# Altium footprint library General.PcbLib: 446 footprints (part 14 of 28)
Each footprint in its own frame and in the unit in brackets; x right, y up, seen from the top. Pads: shape width x height; smd on the part's side, far side on the other; paste and mask are expansions set on the pad; w line width, h text height; cw(c..) or ccw(c..) is an arc to the next point about the centre after c.
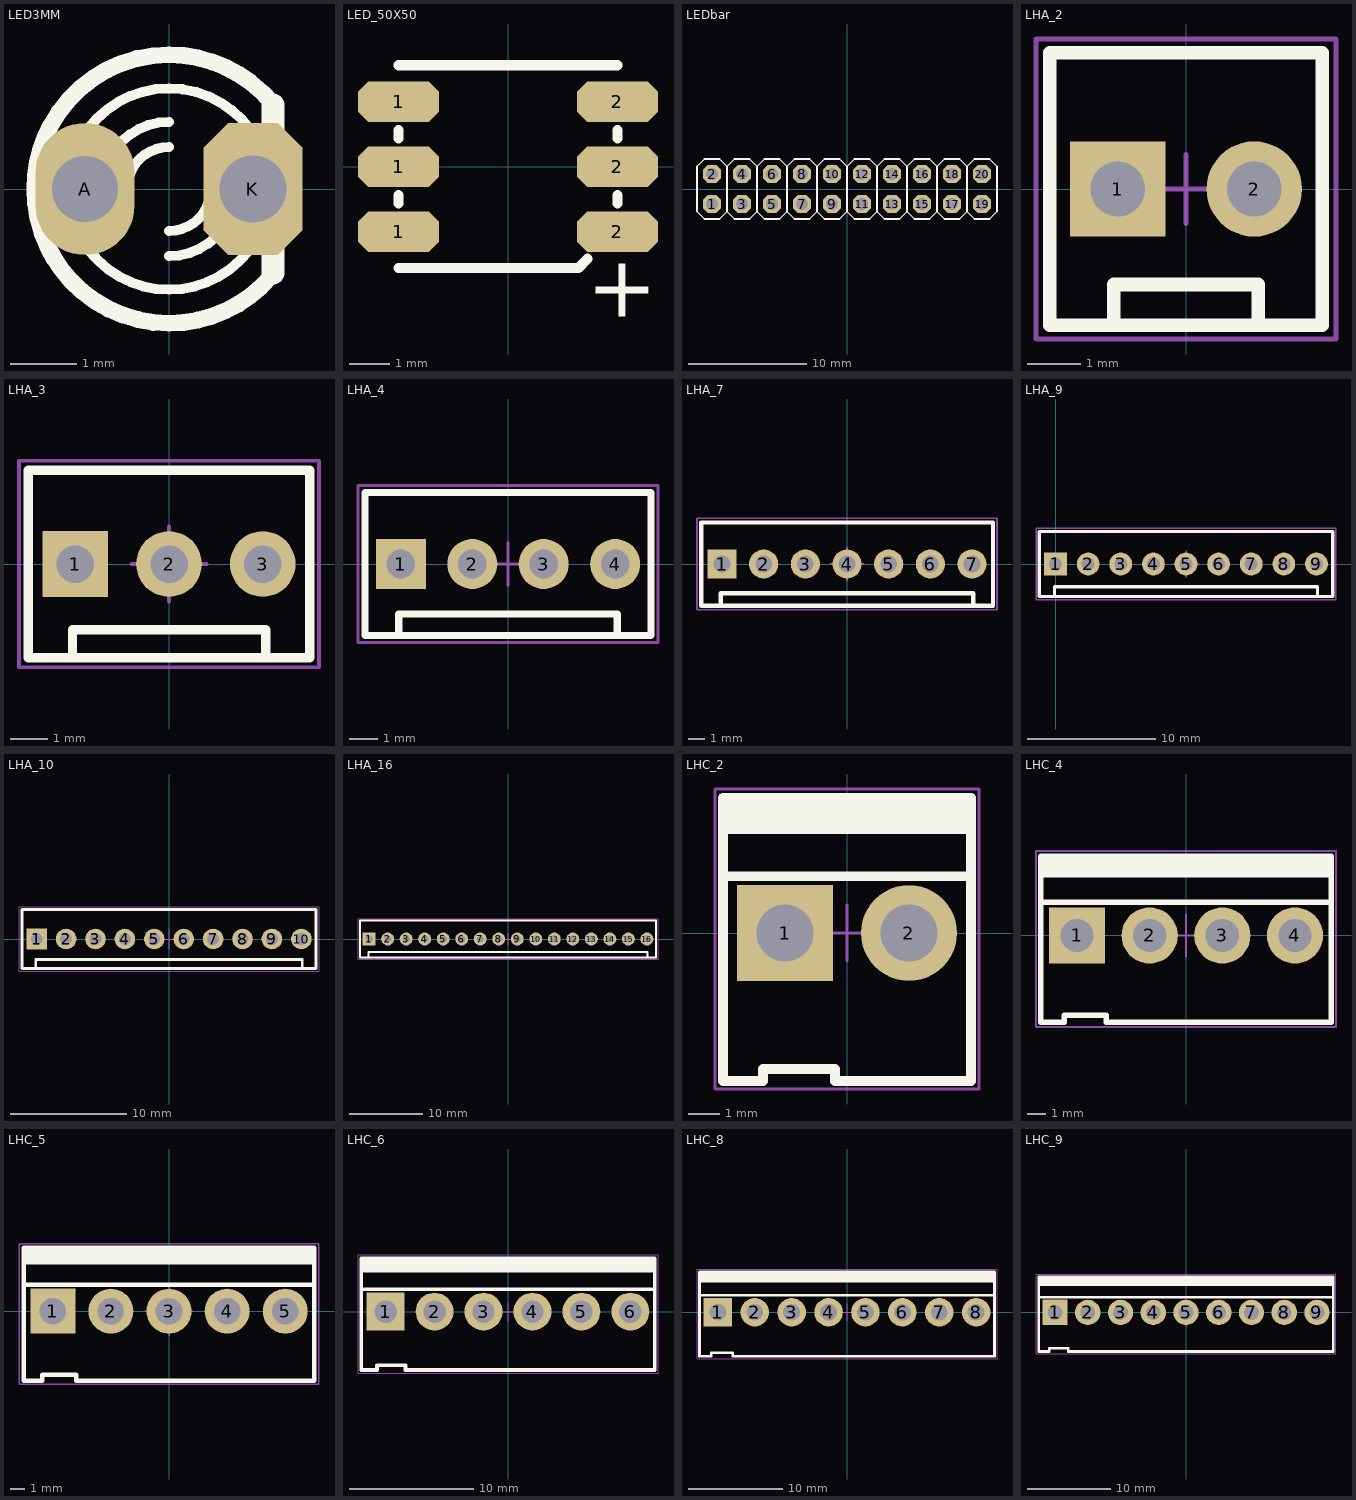
[diagram p13: the footprints below, top view; thin cyan lines are the x and y axes]

## LED3MM [mm]
pads (2):
  oval 1.5x2 hole 1: A(-1.27,0)
  oct 1.5x2 hole 1.016: K(1.27,0)
Top Overlay:
  lines w0.152: -1.219,0.914 cw(c0,0) 0,1.524 cw(c0,0) 1.24,0.886 ; -1.203,-0.936 ccw(c0,0) 0,-1.524 ccw(c0,0) 1.203,-0.936 ; -1.171,0.976 ccw(c0,0) -1.524,0 ccw(c0,0) -1.139,-1.012 ; -1.016,0 cw(c0,0) 0,1.016 ; -0.635,0 cw(c0,0) 0,0.635 ; 0,-1.016 ccw(c0,0) 1.016,0 ; 0,-0.635 ccw(c0,0) 0.635,0 ; 1.157,0.992 cw(c0,0) 1.524,0 cw(c0,0) 1.171,-0.976
  lines w0.254: -1.793,0.956 cw(c0,0) 0,2.032 cw(c0,0) 1.561,1.301 ; -1.789,0.963 ccw(c0,0) -2.032,0 ccw(c0,0) -1.731,-1.065 ; -1.764,-1.008 ccw(c0,0) 0,-2.032 ccw(c0,0) 1.551,-1.313
  lines w0.349: 1.575,-1.27 1.575,1.27
3D body "ALSRobot-LED Red 3mm.step": height 5.4, standoff -2.8, extent -1.946,-1.945 1.549,2.047

## LED_50X50 [mm] "SMD"
pads (6):
  oct 2x1 smd: 1(-2.7,-1.6) 1(-2.7,0) 1(-2.7,1.6) 2(2.7,-1.6) 2(2.7,0) 2(2.7,1.6)
Top Overlay:
  lines w0.254: -2.7,-2.5 1.734,-2.5 1.961,-2.273 ; -2.7,-0.9 -2.7,-0.7 ; -2.7,0.7 -2.7,0.9 ; -2.7,2.5 2.7,2.5 ; 2.7,-0.9 2.7,-0.7 ; 2.7,0.7 2.7,0.9
  text "+" at 1.946,-3.7 h1.52
3D body "LED_50X50.STEP": height 1.5, standoff -0.2, extent -2.708,-2.475 2.642,2.475

## LEDbar [mil]
pads (20):
  oct 60x60 hole 40: 1(-450,-50) 2(-450,50) 3(-350,-50) 4(-350,50) 5(-250,-50) 6(-250,50) 7(-150,-50) 8(-150,50) 9(-50,-50) 10(-50,50) 11(50,-50) 12(50,50) 13(150,-50) 14(150,50) 15(250,-50) 16(250,50) 17(350,-50) 18(350,50) 19(450,-50) 20(450,50)
Top Overlay:
  lines w6: -400,-75 -400,75 ; -400,-75 -375,-100 -325,-100 -300,-75 ; -400,-75 -425,-100 -475,-100 -500,-75 -500,75 -475,100 -425,100 -400,75 ; -400,75 -375,100 -325,100 -300,75 ; -300,-75 -300,75 ; -300,-75 -275,-100 -225,-100 -200,-75 ; -300,75 -275,100 -225,100 -200,75 ; -200,-75 -200,75 ; -200,-75 -175,-100 -125,-100 -100,-75 ; -200,75 -175,100 -125,100 -100,75 ; -100,-75 -100,75 ; -100,-75 -75,-100 -25,-100 0,-75 ; -100,75 -75,100 -25,100 0,75 ; 0,-75 0,75 ; 0,-75 25,-100 75,-100 100,-75 ; 0,75 25,100 75,100 100,75 ; 100,-75 100,75 ; 100,-75 125,-100 175,-100 200,-75 ; 100,75 125,100 175,100 200,75 ; 200,-75 200,75 ; 200,-75 225,-100 275,-100 300,-75 ; 200,75 225,100 275,100 300,75 ; 300,-75 300,75 ; 300,-75 325,-100 375,-100 400,-75 ; 300,75 325,100 375,100 400,75 ; 400,-75 425,-100 475,-100 500,-75 500,75 475,100 425,100 400,75 ; 400,-75 400,75
3D body "Segment Bar Graph or LED Array.step": height 318.11, standoff -81.89, extent -500,-383.86 500,159.45

## LHA_2 [mil] "Connector; Signal; 2 Position ,2.54mm Pitch"
height 452.76
pads (2):
  rect 70x70 hole 40: 1(-50,0)
  round 70 hole 40: 2(50,0)
Top Overlay:
  lines w10: -53,-100 -100,-100 -100,100 100,100 100,-100 53,-100 ; -53,-100 -53,-70 53,-70 53,-100 ; -53,-100 53,-100
Mechanical 13:
  lines w3.94: -53,-100 53,-100 ; -53,-100 -53,-70 53,-70 53,-100 ; -53,-100 -100,-100 -100,100 100,100 100,-100 53,-100 ; -63.78,-13.78 -36.22,-13.78 -36.22,13.78 -63.78,13.78 -63.78,-13.78 ; 36.22,-13.78 36.22,13.78 63.78,13.78 63.78,-13.78 36.22,-13.78
Mechanical 15:
  lines w3.94: -25,0 0,0 ; 0,-25 0,0 ; 0,25 0,0 ; 25,0 0,0 ; -110,-110 110,-110 110,110 -110,110 -110,-110
3D body: height 133.86, standoff 0, extent -99.98,-99.98 99.98,99.98
3D body: height 452.76, standoff 0, extent -52.98,-99.98 52.98,-70.02
3D body: height 425.2, standoff -133.86, extent -63.76,-13.76 -36.24,13.76
3D body: height 425.2, standoff -133.86, extent 36.24,-13.76 63.76,13.76

## LHA_3 [mil] "Connector; Signal; 3 Position ,2.54mm Pitch"
height 452.76
pads (3):
  rect 70x70 hole 40: 1(-100,0)
  round 70 hole 40: 2(0,0) 3(100,0)
Top Overlay:
  lines w10: -103,-100 -103,-70 103,-70 103,-100 ; -103,-100 103,-100 ; -103,-100 -150,-100 -150,100 150,100 150,-100 103,-100
Mechanical 13:
  lines w3.94: -103,-100 -150,-100 -150,100 150,100 150,-100 103,-100 ; -103,-100 103,-100 ; -103,-100 -103,-70 103,-70 103,-100 ; -113.78,-13.78 -86.22,-13.78 -86.22,13.78 -113.78,13.78 -113.78,-13.78 ; -13.78,-13.78 -13.78,13.78 13.78,13.78 13.78,-13.78 -13.78,-13.78 ; 86.22,-13.78 113.78,-13.78 113.78,13.78 86.22,13.78 86.22,-13.78
Mechanical 15:
  lines w3.94: -40,0 0,0 ; 0,-40 0,0 ; 0,40 0,0 ; 40,0 0,0 ; -160,-110 -160,110 160,110 160,-110 -160,-110
3D body: height 452.76, standoff 0, extent -102.98,-99.98 102.98,-70.02
3D body: height 133.86, standoff 0, extent -149.98,-99.98 149.98,99.98
3D body: height 425.2, standoff -133.86, extent -113.76,-13.76 -86.24,13.76
3D body: height 425.2, standoff -133.86, extent -13.76,-13.76 13.76,13.76
3D body: height 425.2, standoff -133.86, extent 86.24,-13.76 113.76,13.76

## LHA_4 [mil] "Connector; Signal; 4 Position ,2.54mm Pitch"
height 452.76
pads (4):
  rect 70x70 hole 40: 1(-150,0)
  round 70 hole 40: 2(-50,0) 3(50,0) 4(150,0)
Top Overlay:
  lines w10: -153,-100 -153,-70 153,-70 153,-100 ; -153,-100 153,-100 ; -153,-100 -200,-100 -200,100 200,100 200,-100 153,-100
Mechanical 13:
  lines w3.94: -153,-100 -200,-100 -200,100 200,100 200,-100 153,-100 ; -153,-100 153,-100 ; -153,-100 -153,-70 153,-70 153,-100 ; -163.78,-13.78 -136.22,-13.78 -136.22,13.78 -163.78,13.78 -163.78,-13.78 ; -63.78,-13.78 -63.78,13.78 -36.22,13.78 -36.22,-13.78 -63.78,-13.78 ; 36.22,-13.78 63.78,-13.78 63.78,13.78 36.22,13.78 36.22,-13.78 ; 136.22,-13.78 136.22,13.78 163.78,13.78 163.78,-13.78 136.22,-13.78
Mechanical 15:
  lines w3.94: -30,0 0,0 ; 0,-30 0,0 ; 0,30 0,0 ; 30,0 0,0 ; -210,-110 210,-110 210,110 -210,110 -210,-110
3D body: height 452.76, standoff 0, extent -152.98,-99.98 152.98,-70.02
3D body: height 133.86, standoff 0, extent -199.98,-99.98 199.98,99.98
3D body: height 425.2, standoff -133.86, extent -163.76,-13.76 -136.24,13.76
3D body: height 425.2, standoff -133.86, extent -63.76,-13.76 -36.24,13.76
3D body: height 425.2, standoff -133.86, extent 36.24,-13.76 63.76,13.76
3D body: height 425.2, standoff -133.86, extent 136.24,-13.76 163.76,13.76

## LHA_7 [mil] "Connector; Signal; 6 Position ,2.54mm Pitch"
height 452.76
pads (7):
  rect 70x70 hole 40: 1(-300,0)
  round 70 hole 40: 2(-200,0) 3(-100,0) 4(0,0) 5(100,0) 6(200,0) 7(300,0)
Top Overlay:
  lines w10: -303,-100 -350,-100 -350,100 350,100 350,-100 303,-100 ; -303,-100 303,-100 ; -303,-100 -303,-70 303,-70 303,-100
Mechanical 13:
  lines w3.94: -303,-100 -303,-70 303,-70 303,-100 ; -303,-100 303,-100 ; -303,-100 -350,-100 -350,100 350,100 350,-100 303,-100 ; -313.78,-13.78 -313.78,13.78 -286.22,13.78 -286.22,-13.78 -313.78,-13.78 ; -213.78,-13.78 -186.22,-13.78 -186.22,13.78 -213.78,13.78 -213.78,-13.78 ; -113.78,-13.78 -113.78,13.78 -86.22,13.78 -86.22,-13.78 -113.78,-13.78 ; -13.78,-13.78 13.78,-13.78 13.78,13.78 -13.78,13.78 -13.78,-13.78 ; 86.22,-13.78 86.22,13.78 113.78,13.78 113.78,-13.78 86.22,-13.78 ; 186.22,-13.78 213.78,-13.78 213.78,13.78 186.22,13.78 186.22,-13.78 ; 286.22,-13.78 286.22,13.78 313.78,13.78 313.78,-13.78 286.22,-13.78
Mechanical 15:
  lines w3.94: -40,0 0,0 ; 0,-40 0,0 ; 0,40 0,0 ; 40,0 0,0 ; -360,-110 360,-110 360,110 -360,110 -360,-110
3D body: height 452.76, standoff 0, extent -302.98,-99.98 302.98,-70.02
3D body: height 133.86, standoff 0, extent -349.98,-99.98 349.98,99.98
3D body: height 425.2, standoff -133.86, extent -213.76,-13.76 -186.24,13.76
3D body: height 425.2, standoff -133.86, extent -313.76,-13.76 -286.24,13.76
3D body: height 425.2, standoff -133.86, extent -13.76,-13.76 13.76,13.76
3D body: height 425.2, standoff -133.86, extent -113.76,-13.76 -86.24,13.76
3D body: height 425.2, standoff -133.86, extent 186.24,-13.76 213.76,13.76
3D body: height 425.2, standoff -133.86, extent 86.24,-13.76 113.76,13.76
3D body: height 425.2, standoff -133.86, extent 286.24,-13.76 313.76,13.76

## LHA_9 [mil] "Connector; Signal; 9 Position ,2.54mm Pitch"
height 452.76
pads (9):
  rect 70x70 hole 40: 1(0,0)
  round 70 hole 40: 2(100,0) 3(200,0) 4(300,0) 5(400,0) 6(500,0) 7(600,0) 8(700,0) 9(800,0)
Top Overlay:
  lines w10: -3,-100 -50,-100 -50,100 850,100 850,-100 803,-100 ; -3,-100 803,-100 ; -3,-100 -3,-70 803,-70 803,-100
Mechanical 13:
  lines w3.94: -3,-100 -3,-70 803,-70 803,-100 ; -3,-100 803,-100 ; -3,-100 -50,-100 -50,100 850,100 850,-100 803,-100 ; -13.78,-13.78 13.78,-13.78 13.78,13.78 -13.78,13.78 -13.78,-13.78 ; 86.22,-13.78 86.22,13.78 113.78,13.78 113.78,-13.78 86.22,-13.78 ; 186.22,-13.78 213.78,-13.78 213.78,13.78 186.22,13.78 186.22,-13.78 ; 286.22,-13.78 286.22,13.78 313.78,13.78 313.78,-13.78 286.22,-13.78 ; 386.22,-13.78 413.78,-13.78 413.78,13.78 386.22,13.78 386.22,-13.78 ; 486.22,-13.78 486.22,13.78 513.78,13.78 513.78,-13.78 486.22,-13.78 ; 586.22,-13.78 613.78,-13.78 613.78,13.78 586.22,13.78 586.22,-13.78 ; 686.22,-13.78 686.22,13.78 713.78,13.78 713.78,-13.78 686.22,-13.78 ; 786.22,-13.78 813.78,-13.78 813.78,13.78 786.22,13.78 786.22,-13.78
Mechanical 15:
  lines w3.94: 360,0 400,0 ; 400,-40 400,0 ; 400,40 400,0 ; 440,0 400,0 ; -60,-110 -60,110 860,110 860,-110 -60,-110
3D body: height 452.76, standoff 0, extent -2.98,-99.98 802.98,-70.02
3D body: height 133.86, standoff 0, extent -49.98,-99.98 849.98,99.98
3D body: height 425.2, standoff -133.86, extent -13.76,-13.76 13.76,13.76
3D body: height 425.2, standoff -133.86, extent 86.24,-13.76 113.76,13.76
3D body: height 425.2, standoff -133.86, extent 186.24,-13.76 213.76,13.76
3D body: height 425.2, standoff -133.86, extent 286.24,-13.76 313.76,13.76
3D body: height 425.2, standoff -133.86, extent 386.24,-13.76 413.76,13.76
3D body: height 425.2, standoff -133.86, extent 486.24,-13.76 513.76,13.76
3D body: height 425.2, standoff -133.86, extent 586.24,-13.76 613.76,13.76
3D body: height 425.2, standoff -133.86, extent 686.24,-13.76 713.76,13.76
3D body: height 425.2, standoff -133.86, extent 786.24,-13.76 813.76,13.76

## LHA_10 [mil] "Connector; Signal; 10 Position ,2.54mm Pitch"
height 452.76
pads (10):
  rect 70x70 hole 40: 1(-450,0)
  round 70 hole 40: 2(-350,0) 3(-250,0) 4(-150,0) 5(-50,0) 6(50,0) 7(150,0) 8(250,0) 9(350,0) 10(450,0)
Top Overlay:
  lines w10: -453,-100 -453,-70 453,-70 453,-100 ; -453,-100 453,-100 ; -453,-100 -500,-100 -500,100 500,100 500,-100 453,-100
Mechanical 13:
  lines w3.94: -453,-100 -500,-100 -500,100 500,100 500,-100 453,-100 ; -453,-100 453,-100 ; -453,-100 -453,-70 453,-70 453,-100 ; -463.78,-13.78 -463.78,13.78 -436.22,13.78 -436.22,-13.78 -463.78,-13.78 ; -363.78,-13.78 -336.22,-13.78 -336.22,13.78 -363.78,13.78 -363.78,-13.78 ; -263.78,-13.78 -263.78,13.78 -236.22,13.78 -236.22,-13.78 -263.78,-13.78 ; -163.78,-13.78 -136.22,-13.78 -136.22,13.78 -163.78,13.78 -163.78,-13.78 ; -63.78,-13.78 -63.78,13.78 -36.22,13.78 -36.22,-13.78 -63.78,-13.78 ; 36.22,-13.78 63.78,-13.78 63.78,13.78 36.22,13.78 36.22,-13.78 ; 136.22,-13.78 136.22,13.78 163.78,13.78 163.78,-13.78 136.22,-13.78 ; 236.22,-13.78 263.78,-13.78 263.78,13.78 236.22,13.78 236.22,-13.78 ; 336.22,-13.78 336.22,13.78 363.78,13.78 363.78,-13.78 336.22,-13.78 ; 436.22,-13.78 463.78,-13.78 463.78,13.78 436.22,13.78 436.22,-13.78
Mechanical 15:
  lines w3.94: -35,0 0,0 ; 0,-35 0,0 ; 0,35 0,0 ; 35,0 0,0 ; -510,-110 510,-110 510,110 -510,110 -510,-110
3D body: height 425.2, standoff -133.86, extent 436.24,-13.76 463.76,13.76
3D body: height 425.2, standoff -133.86, extent 336.24,-13.76 363.76,13.76
3D body: height 425.2, standoff -133.86, extent 236.24,-13.76 263.76,13.76
3D body: height 425.2, standoff -133.86, extent 136.24,-13.76 163.76,13.76
3D body: height 425.2, standoff -133.86, extent 36.24,-13.76 63.76,13.76
3D body: height 425.2, standoff -133.86, extent -63.76,-13.76 -36.24,13.76
3D body: height 425.2, standoff -133.86, extent -163.76,-13.76 -136.24,13.76
3D body: height 425.2, standoff -133.86, extent -263.76,-13.76 -236.24,13.76
3D body: height 425.2, standoff -133.86, extent -363.76,-13.76 -336.24,13.76
3D body: height 425.2, standoff -133.86, extent -463.76,-13.76 -436.24,13.76
3D body: height 133.86, standoff 0, extent -499.98,-99.98 499.98,99.98
3D body: height 452.76, standoff 0, extent -452.98,-99.98 452.98,-70.02

## LHA_16 [mil] "Connector; Signal; 16 Position ,2.54mm Pitch"
height 452.76
pads (16):
  rect 70x70 hole 40: 1(-750,0)
  round 70 hole 40: 2(-650,0) 3(-550,0) 4(-450,0) 5(-350,0) 6(-250,0) 7(-150,0) 8(-50,0) 9(50,0) 10(150,0) 11(250,0) 12(350,0) 13(450,0) 14(550,0) 15(650,0) 16(750,0)
Top Overlay:
  lines w10: -753,-100 753,-100 ; -753,-100 -753,-70 753,-70 753,-100 ; -753,-100 -800,-100 -800,100 800,100 800,-100 753,-100
Mechanical 13:
  lines w3.94: -753,-100 -800,-100 -800,100 800,100 800,-100 753,-100 ; -753,-100 -753,-70 753,-70 753,-100 ; -753,-100 753,-100 ; -763.78,-13.78 -763.78,13.78 -736.22,13.78 -736.22,-13.78 -763.78,-13.78 ; -663.78,-13.78 -636.22,-13.78 -636.22,13.78 -663.78,13.78 -663.78,-13.78 ; -563.78,-13.78 -563.78,13.78 -536.22,13.78 -536.22,-13.78 -563.78,-13.78 ; -463.78,-13.78 -436.22,-13.78 -436.22,13.78 -463.78,13.78 -463.78,-13.78 ; -363.78,-13.78 -363.78,13.78 -336.22,13.78 -336.22,-13.78 -363.78,-13.78 ; -263.78,-13.78 -236.22,-13.78 -236.22,13.78 -263.78,13.78 -263.78,-13.78 ; -163.78,-13.78 -163.78,13.78 -136.22,13.78 -136.22,-13.78 -163.78,-13.78 ; -63.78,-13.78 -36.22,-13.78 -36.22,13.78 -63.78,13.78 -63.78,-13.78 ; 36.22,-13.78 36.22,13.78 63.78,13.78 63.78,-13.78 36.22,-13.78 ; 136.22,-13.78 163.78,-13.78 163.78,13.78 136.22,13.78 136.22,-13.78 ; 236.22,-13.78 236.22,13.78 263.78,13.78 263.78,-13.78 236.22,-13.78 ; 336.22,-13.78 363.78,-13.78 363.78,13.78 336.22,13.78 336.22,-13.78 ; 436.22,-13.78 436.22,13.78 463.78,13.78 463.78,-13.78 436.22,-13.78 ; 536.22,-13.78 563.78,-13.78 563.78,13.78 536.22,13.78 536.22,-13.78 ; 636.22,-13.78 636.22,13.78 663.78,13.78 663.78,-13.78 636.22,-13.78 ; 736.22,-13.78 763.78,-13.78 763.78,13.78 736.22,13.78 736.22,-13.78
Mechanical 15:
  lines w3.94: -30,0 0,0 ; 0,-30 0,0 ; 0,30 0,0 ; 30,0 0,0 ; -810,-110 810,-110 810,110 -810,110 -810,-110
3D body: height 425.2, standoff -133.86, extent 136.24,-13.76 163.76,13.76
3D body: height 425.2, standoff -133.86, extent 36.24,-13.76 63.76,13.76
3D body: height 425.2, standoff -133.86, extent 336.24,-13.76 363.76,13.76
3D body: height 425.2, standoff -133.86, extent 236.24,-13.76 263.76,13.76
3D body: height 425.2, standoff -133.86, extent 536.24,-13.76 563.76,13.76
3D body: height 425.2, standoff -133.86, extent 436.24,-13.76 463.76,13.76
3D body: height 425.2, standoff -133.86, extent 736.24,-13.76 763.76,13.76
3D body: height 425.2, standoff -133.86, extent 636.24,-13.76 663.76,13.76
3D body: height 425.2, standoff -133.86, extent -663.76,-13.76 -636.24,13.76
3D body: height 425.2, standoff -133.86, extent -763.76,-13.76 -736.24,13.76
3D body: height 425.2, standoff -133.86, extent -463.76,-13.76 -436.24,13.76
3D body: height 425.2, standoff -133.86, extent -563.76,-13.76 -536.24,13.76
3D body: height 425.2, standoff -133.86, extent -263.76,-13.76 -236.24,13.76
3D body: height 425.2, standoff -133.86, extent -363.76,-13.76 -336.24,13.76
3D body: height 425.2, standoff -133.86, extent -63.76,-13.76 -36.24,13.76
3D body: height 425.2, standoff -133.86, extent -163.76,-13.76 -136.24,13.76
3D body: height 137.8, standoff 0, extent -799.98,-99.98 799.98,99.98
3D body: height 452.76, standoff 0, extent -752.98,-99.98 752.98,-70.02

## LHC_2 [mil] "Connector; Power; 2 Position,3.96mm Pitch"
height 370.08
pads (2):
  rect 120x120 hole 70.87: 1(-77.5,0)
  round 120 hole 70.87: 2(77.5,0)
Top Overlay:
  rectangle: -155,129.92 155,169.29
  lines w12: -155,70.96 155,70.96 ; -155,-185.04 -105,-185.04 -105,-170 -15,-170 -15,-185.04 155,-185.04 155,129.92 ; -155,-185.04 -155,129.92 ; -155,-185.04 -155,129.92 ; -155,129.92 155,129.92 ; -155,129.92 -155,169.29 155,169.29 155,129.92
Mechanical 13:
  lines w3.94: -155,70.96 155,70.96 ; -155,-185.04 -155,129.92 ; -155,-185.04 -155,129.92 ; -155,-185.04 -105,-185.04 -105,-170 -15,-170 -15,-185.04 155,-185.04 155,129.92 ; -155,129.92 -155,169.29 155,169.29 155,129.92 ; -155,129.92 155,129.92 ; -105.06,-27.56 -105.06,27.56 -49.94,27.56 -49.94,-27.56 -105.06,-27.56 ; 49.94,-27.56 105.06,-27.56 105.06,27.56 49.94,27.56 49.94,-27.56
Mechanical 15:
  lines w3.94: -35,0 0,0 ; 0,-35 0,0 ; 0,35 0,0 ; 35,0 0,0 ; -165,-195 -165,180 165,180 165,-195 -165,-195
3D body: height 370.08, standoff 0, extent -155,70.96 154.96,129.92
3D body: height 370.08, standoff 314.96, extent -154.98,129.94 154.98,169.27
3D body: height 129.92, standoff 0, extent -154.98,-185.02 154.98,70.96
3D body: height 429.92, standoff -145.67, extent 49.96,-27.54 105.04,27.54
3D body: height 429.92, standoff -145.67, extent -105.04,-27.54 -49.96,27.54

## LHC_4 [mil] "Connector; Power; 4 Position,3.96mm Pitch"
height 370.08
pads (4):
  rect 120x120 hole 70.87: 1(-232.5,0)
  round 120 hole 70.87: 2(-77.5,0) 3(77.5,0) 4(232.5,0)
Top Overlay:
  rectangle: -310,129.92 310,169.29
  lines w12: -310,70.96 310,70.96 ; -310,129.92 0,129.92 310,129.92 ; -310,129.92 -310,-185.04 -260,-185.04 -260,-170 -170,-170 -170,-185.04 310,-185.04 310,129.92 ; -310,129.92 -310,169.29 310,169.29 310,129.92
Mechanical 13:
  lines w3.94: -310,70.96 310,70.96 ; -310,129.92 -310,169.29 310,169.29 310,129.92 ; -310,129.92 -310,-185.04 -260,-185.04 -260,-170 -170,-170 -170,-185.04 310,-185.04 310,129.92 ; -310,129.92 0,129.92 310,129.92 ; -260.06,-27.56 -260.06,27.56 -204.94,27.56 -204.94,-27.56 -260.06,-27.56 ; -105.06,-27.56 -49.94,-27.56 -49.94,27.56 -105.06,27.56 -105.06,-27.56 ; 49.94,-27.56 49.94,27.56 105.06,27.56 105.06,-27.56 49.94,-27.56 ; 204.94,-27.56 260.06,-27.56 260.06,27.56 204.94,27.56 204.94,-27.56
Mechanical 15:
  lines w3.94: -45,0 0,0 ; 0,-45 0,0 ; 0,45 0,0 ; 45,0 0,0 ; -320,-195 -320,180 320,180 320,-195 -320,-195
3D body: height 429.92, standoff -145.67, extent -105.04,-27.54 -49.96,27.54
3D body: height 429.92, standoff -145.67, extent -260.04,-27.54 -204.96,27.54
3D body: height 429.92, standoff -145.67, extent 204.96,-27.54 260.04,27.54
3D body: height 429.92, standoff -145.67, extent 49.96,-27.54 105.04,27.54
3D body: height 370.08, standoff 0, extent -309.98,70.98 309.98,129.9
3D body: height 370.08, standoff 330.71, extent -309.98,129.94 309.98,169.27
3D body: height 129.92, standoff 0, extent -309.98,-185.02 309.98,70.94

## LHC_5 [mil] "Connector; Power; 5 Position,3.96mm Pitch"
pads (5):
  rect 120x120 hole 70.87: 1(-310,0)
  round 120 hole 70.87: 2(-155,0) 3(0,0) 4(155,0) 5(310,0)
Top Overlay:
  rectangle: -387.5,129.92 387.5,169.29
  lines w12: -387.5,70.96 387.5,70.96 ; 387.5,129.92 -387.5,129.92 ; -387.5,129.92 -387.5,-185.04 -337.5,-185.04 -337.5,-170 -247.5,-170 -247.5,-185.04 387.5,-185.04 387.5,169.29 -387.5,169.29 -387.5,129.92
Mechanical 13:
  lines w3.94: -387.5,70.96 387.5,70.96 ; 387.5,129.92 -387.5,129.92 ; -387.5,129.92 -387.5,169.29 387.5,169.29 387.5,-185.04 -247.5,-185.04 -247.5,-170 -337.5,-170 -337.5,-185.04 -387.5,-185.04 -387.5,129.92 ; -337.56,-27.56 -337.56,27.56 -282.44,27.56 -282.44,-27.56 -337.56,-27.56 ; -182.56,-27.56 -127.44,-27.56 -127.44,27.56 -182.56,27.56 -182.56,-27.56 ; -27.56,-27.56 -27.56,27.56 27.56,27.56 27.56,-27.56 -27.56,-27.56 ; 127.44,-27.56 182.56,-27.56 182.56,27.56 127.44,27.56 127.44,-27.56 ; 282.44,-27.56 282.44,27.56 337.56,27.56 337.56,-27.56 282.44,-27.56
Mechanical 15:
  lines w3.94: -65,0 0,0 ; 0,-65 0,0 ; 0,65 0,0 ; 65,0 0,0 ; -400,-195 -400,180 400,180 400,-195 -400,-195
3D body: height 429.92, standoff -145.67, extent 282.46,-27.54 337.54,27.54
3D body: height 429.92, standoff -145.67, extent 127.46,-27.54 182.54,27.54
3D body: height 429.92, standoff -145.67, extent -27.54,-27.54 27.54,27.54
3D body: height 429.92, standoff -145.67, extent -182.54,-27.54 -127.46,27.54
3D body: height 429.92, standoff -145.67, extent -337.54,-27.54 -282.46,27.54
3D body: height 370.08, standoff 330.71, extent -387.48,129.94 387.48,169.27
3D body: height 129.92, standoff 0, extent -387.48,-185.02 387.48,70.94
3D body: height 370.08, standoff 0, extent -387.48,70.98 387.48,129.9

## LHC_6 [mil] "Connector; Power; 6 Position,3.96mm Pitch"
height 370.08
pads (6):
  rect 120x120 hole 70.87: 1(-387.5,0)
  round 120 hole 70.87: 2(-232.5,0) 3(-77.5,0) 4(77.5,0) 5(232.5,0) 6(387.5,0)
Top Overlay:
  rectangle: -465,129.92 465,169.29
  lines w12: -465,70.96 465,70.96 ; -155,169.29 -465,169.29 ; 465,129.92 -465,129.92 ; -465,-185.04 -465,129.92 ; -465,-185.04 -465,129.92 ; -465,-185.04 -415,-185.04 -415,-170 -325,-170 ; -465,129.92 -465,169.29 ; -465,169.29 465,169.29 465,-185.04 -325,-185.04 ; -325,-185.04 -325,-170 ; -325,-185.04 -325,-170
Mechanical 13:
  lines w3.94: -465,70 465,70 ; -465,129.92 465,129.92 ; -465,-185.04 -465,169.29 465,169.29 465,-185.04 -325,-185.04 -325,-170 -415,-170 -415,-185.04 -465,-185.04 ; -415.06,-27.56 -359.94,-27.56 -359.94,27.56 -415.06,27.56 -415.06,-27.56 ; -260.06,-27.56 -260.06,27.56 -204.94,27.56 -204.94,-27.56 -260.06,-27.56 ; -105.06,-27.56 -49.94,-27.56 -49.94,27.56 -105.06,27.56 -105.06,-27.56 ; 49.94,-27.56 49.94,27.56 105.06,27.56 105.06,-27.56 49.94,-27.56 ; 204.94,-27.56 260.06,-27.56 260.06,27.56 204.94,27.56 204.94,-27.56 ; 359.94,-27.56 359.94,27.56 415.06,27.56 415.06,-27.56 359.94,-27.56
Mechanical 15:
  lines w3.94: -30,0 0,0 ; 0,-30 0,0 ; 0,30 0,0 ; 30,0 0,0 ; -475,-195 -475,180 475,180 475,-195 -475,-195
3D body: height 129.92, standoff 0, extent -464.98,-185.02 464.98,69.98
3D body: height 370.08, standoff 0, extent -464.98,70.02 464.98,129.9
3D body: height 370.08, standoff 330.71, extent -464.98,129.94 464.98,169.27
3D body: height 429.92, standoff -145.67, extent 204.96,-27.54 260.04,27.54
3D body: height 429.92, standoff -145.67, extent 359.96,-27.54 415.04,27.54
3D body: height 429.92, standoff -145.67, extent -105.04,-27.54 -49.96,27.54
3D body: height 429.92, standoff -145.67, extent 49.96,-27.54 105.04,27.54
3D body: height 429.92, standoff -145.67, extent -415.04,-27.54 -359.96,27.54
3D body: height 429.92, standoff -145.67, extent -260.04,-27.54 -204.96,27.54

## LHC_8 [mil] "Connector; Power; 8 Position,3.96mm Pitch"
height 370.08
pads (8):
  rect 120x120 hole 70.87: 1(-542.5,0)
  round 120 hole 70.87: 2(-387.5,0) 3(-232.5,0) 4(-77.5,0) 5(77.5,0) 6(232.5,0) 7(387.5,0) 8(542.5,0)
Top Overlay:
  rectangle: -620,129.92 620,169.29
  lines w12: -620,70.96 -310,70.96 ; -620,71 620,71 ; 620,129.92 -620,129.92 ; -620,129.92 -620,-185.04 -570,-185.04 -570,-170 -480,-170 -480,-185.04 620,-185.04 620,169.29 -620,169.29 -620,129.92
Mechanical 13:
  lines w3.94: -620,70.96 -310,70.96 ; -620,71 620,71 ; 620,129.92 -620,129.92 ; -620,129.92 -620,169.29 620,169.29 620,-185.04 -480,-185.04 -480,-170 -570,-170 -570,-185.04 -620,-185.04 -620,129.92 ; -570.06,-27.56 -570.06,27.56 -514.94,27.56 -514.94,-27.56 -570.06,-27.56 ; -415.06,-27.56 -359.94,-27.56 -359.94,27.56 -415.06,27.56 -415.06,-27.56 ; -260.06,-27.56 -260.06,27.56 -204.94,27.56 -204.94,-27.56 -260.06,-27.56 ; -105.06,-27.56 -49.94,-27.56 -49.94,27.56 -105.06,27.56 -105.06,-27.56 ; 49.94,-27.56 49.94,27.56 105.06,27.56 105.06,-27.56 49.94,-27.56 ; 204.94,-27.56 260.06,-27.56 260.06,27.56 204.94,27.56 204.94,-27.56 ; 359.94,-27.56 359.94,27.56 415.06,27.56 415.06,-27.56 359.94,-27.56 ; 514.94,-27.56 570.06,-27.56 570.06,27.56 514.94,27.56 514.94,-27.56
Mechanical 15:
  lines w3.94: -35,0 0,0 ; 0,-35 0,0 ; 0,35 0,0 ; 35,0 0,0 ; -630,-195 630,-195 630,180 -630,180 -630,-195
3D body: height 129.92, standoff 0, extent -619.98,-185.02 619.98,70.98
3D body: height 370.08, standoff 0, extent -619.98,71.02 619.98,129.9
3D body: height 370.08, standoff 330.71, extent -619.98,129.94 619.98,169.27
3D body: height 429.92, standoff -145.67, extent -415.04,-27.54 -359.96,27.54
3D body: height 429.92, standoff -145.67, extent -570.04,-27.54 -514.96,27.54
3D body: height 429.92, standoff -145.67, extent -105.04,-27.54 -49.96,27.54
3D body: height 429.92, standoff -145.67, extent -260.04,-27.54 -204.96,27.54
3D body: height 429.92, standoff -145.67, extent 204.96,-27.54 260.04,27.54
3D body: height 429.92, standoff -145.67, extent 49.96,-27.54 105.04,27.54
3D body: height 429.92, standoff -145.67, extent 514.96,-27.54 570.04,27.54
3D body: height 429.92, standoff -145.67, extent 359.96,-27.54 415.04,27.54

## LHC_9 [mil] "Connector; Power; 9 Position,3.96mm Pitch"
height 370.08
pads (9):
  rect 120x120 hole 70.87: 1(-620,0)
  round 120 hole 70.87: 2(-465,0) 3(-310,0) 4(-155,0) 5(0,0) 6(155,0) 7(310,0) 8(465,0) 9(620,0)
Top Overlay:
  rectangle: -697.5,128 697.5,167.37
  lines w12: -697.5,71 697.5,71 ; 697.5,129.92 -697.5,129.92 ; -697.5,129.92 -697.5,169.29 697.5,169.29 697.5,-185.04 -557.5,-185.04 -557.5,-170 ; -697.5,129.92 -697.5,-185.04 -647.5,-185.04 -647.5,-170 ; -647.5,-170 -557.5,-170 ; -647.5,-170 -557.5,-170
Mechanical 13:
  lines w3.94: -697.5,71 697.5,71 ; 697.5,129.92 -697.5,129.92 ; -697.5,129.92 -697.5,-185.04 -647.5,-185.04 -647.5,-170 ; -697.5,129.92 -697.5,169.29 697.5,169.29 697.5,-185.04 -557.5,-185.04 -557.5,-170 ; -647.5,-170 -557.5,-170 ; -647.5,-170 -557.5,-170 ; -647.56,-27.56 -592.44,-27.56 -592.44,27.56 -647.56,27.56 -647.56,-27.56 ; -492.56,-27.56 -492.56,27.56 -437.44,27.56 -437.44,-27.56 -492.56,-27.56 ; -337.56,-27.56 -282.44,-27.56 -282.44,27.56 -337.56,27.56 -337.56,-27.56 ; -182.56,-27.56 -127.44,-27.56 -127.44,27.56 -182.56,27.56 -182.56,-27.56 ; -27.56,-27.56 -27.56,27.56 27.56,27.56 27.56,-27.56 -27.56,-27.56 ; 127.44,-27.56 182.56,-27.56 182.56,27.56 127.44,27.56 127.44,-27.56 ; 282.44,-27.56 337.56,-27.56 337.56,27.56 282.44,27.56 282.44,-27.56 ; 437.44,-27.56 437.44,27.56 492.56,27.56 492.56,-27.56 437.44,-27.56 ; 592.44,-27.56 647.56,-27.56 647.56,27.56 592.44,27.56 592.44,-27.56
Mechanical 15:
  lines w3.94: -65,0 0,0 ; 0,-65 0,0 ; 0,65 0,0 ; 65,0 0,0 ; -710,-195 -710,180 710,180 710,-195 -710,-195
3D body: height 129.92, standoff 0, extent -697.48,-185.02 697.48,70.98
3D body: height 370.08, standoff 0, extent -697.48,71.02 697.48,129.9
3D body: height 370.08, standoff 330.71, extent -697.48,129.94 697.48,169.27
3D body: height 429.92, standoff -145.67, extent -337.54,-27.54 -282.46,27.54
3D body: height 429.92, standoff -145.67, extent -647.56,-27.56 -592.48,27.52
3D body: height 429.92, standoff -145.67, extent -492.54,-27.54 -437.46,27.54
3D body: height 429.92, standoff -145.67, extent 127.46,-27.54 182.54,27.54
3D body: height 429.92, standoff -145.67, extent -182.56,-27.56 -127.48,27.52
3D body: height 429.92, standoff -145.67, extent -27.54,-27.54 27.54,27.54
3D body: height 429.92, standoff -145.67, extent 592.46,-27.54 647.54,27.54
3D body: height 429.92, standoff -145.67, extent 282.44,-27.56 337.52,27.52
3D body: height 429.92, standoff -145.67, extent 437.46,-27.54 492.54,27.54